# Altium footprint library pcb2D3D库101.PcbLib: 411 footprints (part 17 of 26)
Each footprint in its own frame and in the unit in brackets; x right, y up, seen from the top. Pads: shape width x height; smd on the part's side, far side on the other; paste and mask are expansions set on the pad; w line width, h text height; cw(c..) or ccw(c..) is an arc to the next point about the centre after c.
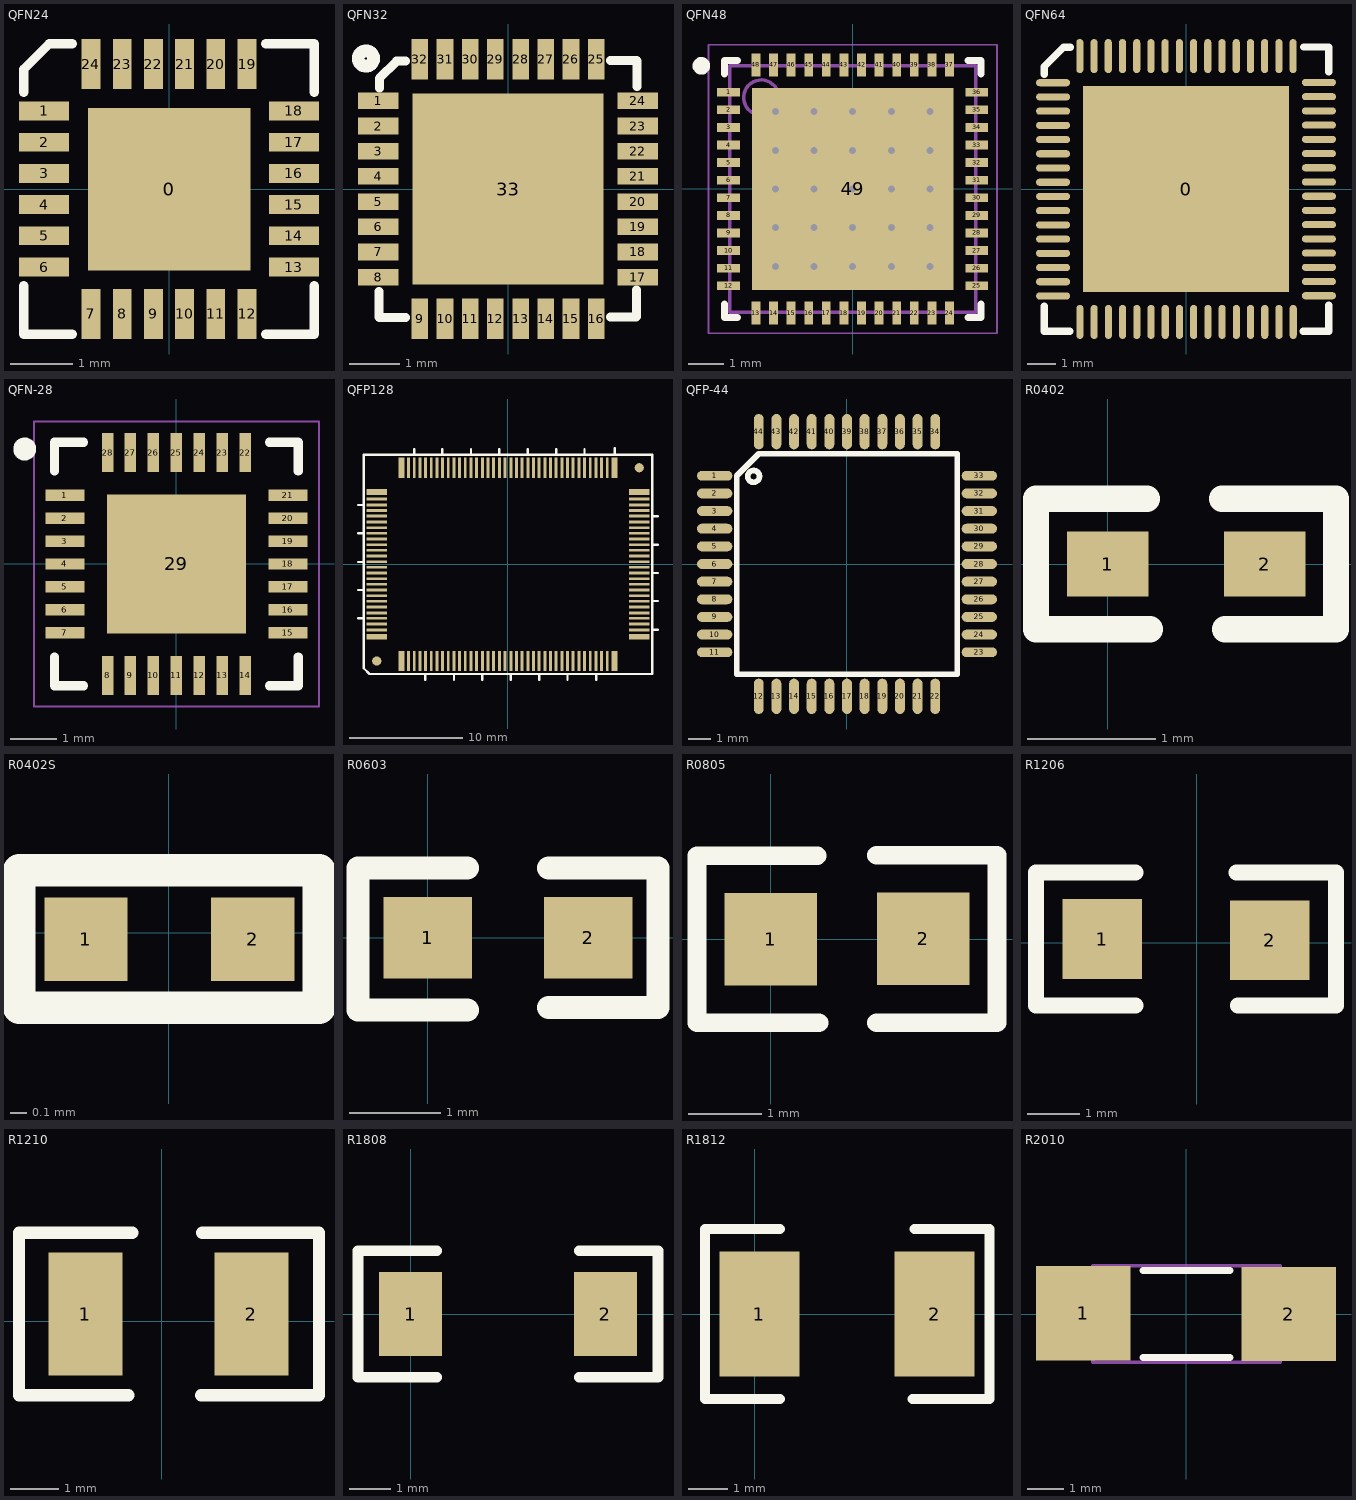
[diagram p16: the footprints below, top view; thin cyan lines are the x and y axes]

## QFN24 [mm]
pads (25):
  rect 2.6x2.6 smd: 0(0.005,0)
  rect 0.8x0.3 smd: 1(-2,1.25) 2(-2,0.75) 3(-2,0.25) 4(-2,-0.25) 5(-2,-0.75) 6(-2,-1.25) 13(2,-1.25) 14(2,-0.75) 15(2,-0.25) 16(2,0.25) 17(2,0.75) 18(2,1.25)
  rect 0.3x0.8 smd: 7(-1.25,-2) 8(-0.75,-2) 9(-0.25,-2) 10(0.25,-2) 11(0.75,-2) 12(1.25,-2) 19(1.25,2) 20(0.75,2) 21(0.25,2) 22(-0.25,2) 23(-0.75,2) 24(-1.25,2)
TopOverlay:
  lines w0.15: -2.325,-1.55 -2.325,-2.325 -1.55,-2.325 ; -2.325,1.55 -2.325,1.917 -1.917,2.325 -1.55,2.325 ; 1.55,-2.325 2.325,-2.325 2.325,-1.55 ; 1.55,2.325 2.325,2.325 2.325,1.55
3D body "QFN24.step": height 0.9, standoff 0, extent -1.997,-2.002 2.007,2.002

## QFN32 [mil]
pads (33):
  rect 31.5x13 smd: 1(-101.5,68.92) 2(-101.5,49.23) 3(-101.5,29.54) 4(-101.5,9.85) 5(-101.5,-9.85) 6(-101.5,-29.54) 7(-101.5,-49.23) 8(-101.5,-68.92) 17(101.5,-68.92) 18(101.5,-49.23) 19(101.5,-29.54) 20(101.5,-9.85) 21(101.5,9.85) 22(101.5,29.54) 23(101.5,49.23) 24(101.5,68.92)
  rect 13x31.5 smd: 9(-68.92,-101.5) 10(-49.23,-101.5) 11(-29.54,-101.5) 12(-9.85,-101.5) 13(9.85,-101.5) 14(29.54,-101.5) 15(49.23,-101.5) 16(68.92,-101.5) 25(68.92,101.5) 26(49.23,101.5) 27(29.54,101.5) 28(9.85,101.5) 29(-9.85,101.5) 30(-29.54,101.5) 31(-49.23,101.5) 32(-68.92,101.5)
  rect 149.61x149.61 smd: 33(0,0)
TopOverlay:
  circle w10: c-111,102 r6
  lines w7: -101,-80 -101,-100 -100.5,-100.5 -80,-100.5 ; -100.5,79 -100.5,86.5 -87,100 -80,100 ; 80,-100 100,-100 100.5,-99.5 100.5,-79 ; 80,100.5 100.5,100.5 101,100 101,80
3D body "qfn32-5x5.step": height 31.5, standoff 0, extent -98.2,-98.81 99.44,98.82

## QFN48 [mm] "QFN, 48-Leads, Body 7.00x7.00mm, Pitch 0.50mm, Thermal Pad 5.73x5.73mm, IPC Medium Density"
height 1
pads (49):
  rect 0.65x0.25 smd: 1(-3.525,2.75) 2(-3.525,2.25) 3(-3.525,1.75) 4(-3.525,1.25) 5(-3.525,0.75) 6(-3.525,0.25) 7(-3.525,-0.25) 8(-3.525,-0.75) 9(-3.525,-1.25) 10(-3.525,-1.75) 11(-3.525,-2.25) 12(-3.525,-2.75) 25(3.525,-2.75) 26(3.525,-2.25) 27(3.525,-1.75) 28(3.525,-1.25) 29(3.525,-0.75) 30(3.525,-0.25) 31(3.525,0.25) 32(3.525,0.75) 33(3.525,1.25) 34(3.525,1.75) 35(3.525,2.25) 36(3.525,2.75)
  rect 0.25x0.65 smd: 13(-2.75,-3.525) 14(-2.25,-3.525) 15(-1.75,-3.525) 16(-1.25,-3.525) 17(-0.75,-3.525) 18(-0.25,-3.525) 19(0.25,-3.525) 20(0.75,-3.525) 21(1.25,-3.525) 22(1.75,-3.525) 23(2.25,-3.525) 24(2.75,-3.525) 37(2.75,3.525) 38(2.25,3.525) 39(1.75,3.525) 40(1.25,3.525) 41(0.75,3.525) 42(0.25,3.525) 43(-0.25,3.525) 44(-0.75,3.525) 45(-1.25,3.525) 46(-1.75,3.525) 47(-2.25,3.525) 48(-2.75,3.525)
  rect 5.73x5.73 smd: 49(0,0)
via 2.2,-2.2 diameter 0.5 hole 0.2
via 1.1,-2.2 diameter 0.5 hole 0.2
via 0,-2.2 diameter 0.5 hole 0.2
via -1.1,-2.2 diameter 0.5 hole 0.2
via -2.2,-2.2 diameter 0.5 hole 0.2
via 2.2,-1.1 diameter 0.5 hole 0.2
via 1.1,-1.1 diameter 0.5 hole 0.2
via 0,-1.1 diameter 0.5 hole 0.2
via -1.1,-1.1 diameter 0.5 hole 0.2
via -2.2,-1.1 diameter 0.5 hole 0.2
via 2.2,0 diameter 0.5 hole 0.2
via 1.1,0 diameter 0.5 hole 0.2
via 0,0 diameter 0.5 hole 0.2
via -1.1,0 diameter 0.5 hole 0.2
via -2.2,0 diameter 0.5 hole 0.2
via 2.2,1.1 diameter 0.5 hole 0.2
via 1.1,1.1 diameter 0.5 hole 0.2
via 0,1.1 diameter 0.5 hole 0.2
via -1.1,1.1 diameter 0.5 hole 0.2
via -2.2,1.1 diameter 0.5 hole 0.2
via 2.2,2.2 diameter 0.5 hole 0.2
via 1.1,2.2 diameter 0.5 hole 0.2
via 0,2.2 diameter 0.5 hole 0.2
via -1.1,2.2 diameter 0.5 hole 0.2
via -2.2,2.2 diameter 0.5 hole 0.2
TopOverlay:
  circle w0.25: c-4.3,3.5 r0.125
  lines w0.2: -3.65,-3.275 -3.65,-3.65 -3.275,-3.65 ; -3.65,3.275 -3.65,3.65 -3.275,3.65 ; 3.275,-3.65 3.65,-3.65 3.65,-3.275 ; 3.275,3.65 3.65,3.65 3.65,3.275
Mechanical13:
  circle w0.1: c-2.6,2.6 r0.5
  lines w0.1: -3.5,-3.5 3.5,-3.5 3.5,3.5 -3.5,3.5 -3.5,-3.5
Mechanical15:
  lines w0.05: -4.1,-4.1 4.1,-4.1 4.1,4.1 -4.1,4.1 -4.1,-4.1
  lines w0.1: -0.5,0 0.5,0 ; 0,-0.5 0,0.5
3D body: height 1, standoff 0.08, extent -3.5,-3.556 3.5,3.444

## QFN64 [mm]
pads (65):
  rect 7.25x7.25 smd: 0(0,-0.001)
  oval 1.2x0.25 smd: 1(-4.674,3.738) 2(-4.674,3.238) 3(-4.674,2.738) 4(-4.674,2.238) 5(-4.674,1.738) 6(-4.674,1.238) 7(-4.674,0.738) 8(-4.674,0.238) 9(-4.674,-0.262) 10(-4.674,-0.762) 11(-4.674,-1.262) 12(-4.674,-1.762) 13(-4.674,-2.262) 14(-4.674,-2.762) 15(-4.674,-3.262) 16(-4.674,-3.762) 33(4.674,-3.754) 34(4.674,-3.254) 35(4.674,-2.754) 36(4.674,-2.254) 37(4.674,-1.754) 38(4.674,-1.254) 39(4.674,-0.754) 40(4.674,-0.254) 41(4.674,0.246) 42(4.674,0.746) 43(4.674,1.246) 44(4.674,1.746) 45(4.674,2.246) 46(4.674,2.746) 47(4.674,3.246) 48(4.674,3.746)
  oval 0.25x1.2 smd: 17(-3.73,-4.675) 18(-3.23,-4.675) 19(-2.73,-4.675) 20(-2.23,-4.675) 21(-1.73,-4.675) 22(-1.23,-4.675) 23(-0.73,-4.675) 24(-0.23,-4.675) 25(0.27,-4.675) 26(0.77,-4.675) 27(1.27,-4.675) 28(1.77,-4.675) 29(2.27,-4.675) 30(2.77,-4.675) 31(3.27,-4.675) 32(3.77,-4.675) 49(3.767,4.675) 50(3.267,4.675) 51(2.767,4.675) 52(2.267,4.675) 53(1.767,4.675) 54(1.267,4.675) 55(0.767,4.675) 56(0.267,4.675) 57(-0.233,4.675) 58(-0.733,4.675) 59(-1.233,4.675) 60(-1.733,4.675) 61(-2.233,4.675) 62(-2.733,4.675) 63(-3.233,4.675) 64(-3.733,4.675)
TopOverlay:
  lines w0.254: -4.983,-4.116 -4.983,-5.004 -4.089,-5.004 ; -4.983,4.032 -4.983,4.312 -4.31,4.985 -4.064,4.985 ; 4.115,-5.004 5.017,-5.004 5.017,-4.091 ; 4.14,4.995 5.017,4.996 5.017,4.113
3D body "User Library-QFN64-2.step": height 0.9, standoff 0, extent -4.52,-4.521 4.52,4.519

## QFN-28 [mm] "QFN, 28-Leads, Body 5.00x5.00mm, Pitch 0.50mm, Thermal Pad 3.03x3.03mm, IPC Medium Density"
height 0.9
pads (29):
  rect 0.85x0.25 smd: 1(-2.425,1.5) 2(-2.425,1) 3(-2.425,0.5) 4(-2.425,0) 5(-2.425,-0.5) 6(-2.425,-1) 7(-2.425,-1.5) 15(2.425,-1.5) 16(2.425,-1) 17(2.425,-0.5) 18(2.425,0) 19(2.425,0.5) 20(2.425,1) 21(2.425,1.5)
  rect 0.25x0.85 smd: 8(-1.5,-2.425) 9(-1,-2.425) 10(-0.5,-2.425) 11(0,-2.425) 12(0.5,-2.425) 13(1,-2.425) 14(1.5,-2.425) 22(1.5,2.425) 23(1,2.425) 24(0.5,2.425) 25(0,2.425) 26(-0.5,2.425) 27(-1,2.425) 28(-1.5,2.425)
  rect 3.03x3.03 smd: 29(0,0)
TopOverlay:
  circle w0.25: c-3.3,2.5 r0.125
  lines w0.2: -2.65,-2.025 -2.65,-2.65 -2.025,-2.65 ; -2.65,2.025 -2.65,2.65 -2.025,2.65 ; 2.025,-2.65 2.65,-2.65 2.65,-2.025 ; 2.025,2.65 2.65,2.65 2.65,2.025
Mechanical15:
  lines w0.05: -3.1,-3.1 -3.1,3.1 3.1,3.1 3.1,-3.1 -3.1,-3.1
  lines w0.1: -0.5,0 0.5,0 ; 0,-0.5 0,0.5
3D body "User Library-QFN28.STEP": height 0.9, standoff 0, extent -2.5,-2.525 2.54,2.515

## QFP128 [mil]
pads (130):
  rect 20x70 smd: 1(-369,-335) 38(369,-335) 65(369,335) 102(-369,335)
  rect 10x70 smd: 2(-345,-335) 3(-325,-335) 4(-305,-335) 5(-286,-335) 6(-266,-335) 7(-246,-335) 8(-227,-335) 9(-207,-335) 10(-187,-335) 11(-168,-335) 12(-148,-335) 13(-128,-335) 14(-109,-335) 15(-89,-335) 16(-69,-335) 17(-50,-335) 18(-30,-335) 19(-10,-335) 20(10,-335) 21(29,-335) 22(49,-335) 23(69,-335) 24(88,-335) 25(108,-335) 26(128,-335) 27(147,-335) 28(167,-335) 29(187,-335) 30(206,-335) 31(226,-335) 32(246,-335) 33(265,-335) 34(285,-335) 35(305,-335) 36(324,-335) 37(344,-335) 66(344,335) 67(324,335) 68(305,335) 69(285,335) 70(265,335) 71(246,335) 72(226,335) 73(206,335) 74(187,335) 75(167,335) 76(147,335) 77(128,335) 78(108,335) 79(88,335) 80(69,335) 81(49,335) 82(29,335) 83(10,335) 84(-10,335) 85(-30,335) 86(-50,335) 87(-69,335) 88(-89,335) 89(-109,335) 90(-128,335) 91(-148,335) 92(-168,335) 93(-187,335) 94(-207,335) 95(-227,335) 96(-246,335) 97(-266,335) 98(-286,335) 99(-305,335) 100(-325,335) 101(-345,335)
  rect 70x20 smd: 39(455,-251) 64(455,251) 103(-455,251) 128(-455,-251)
  rect 70x10 smd: 40(455,-227) 41(455,-207) 42(455,-187) 43(455,-168) 44(455,-148) 45(455,-128) 46(455,-109) 47(455,-89) 48(455,-69) 49(455,-50) 50(455,-30) 51(455,-10) 52(455,9) 53(455,29) 54(455,49) 55(455,68) 56(455,88) 57(455,108) 58(455,127) 59(455,147) 60(455,167) 61(455,187) 62(455,206) 63(455,226) 104(-455,226) 105(-455,206) 106(-455,187) 107(-455,167) 108(-455,147) 109(-455,127) 110(-455,108) 111(-455,88) 112(-455,68) 113(-455,49) 114(-455,29) 115(-455,9) 116(-455,-10) 117(-455,-30) 118(-455,-50) 119(-455,-69) 120(-455,-89) 121(-455,-109) 122(-455,-128) 123(-455,-148) 124(-455,-168) 125(-455,-187) 126(-455,-207) 127(-455,-227)
  round 32 smd: 129(-455,-335) 130(455,335)
TopOverlay:
  lines w8: -520,-187 -500,-187 ; -520,-89 -500,-89 ; -520,8 -500,8 ; -520,108 -500,108 ; -520,205.5 -500,205.5 ; -325,380 -325,400 ; -287,-400 -287,-380 ; -227.5,380 -227.5,400 ; -187,-400 -187,-380 ; -128,380 -128,400 ; -89.5,-400 -89.5,-380 ; -30,380 -30,400 ; 10,-400 10,-380 ; 69,380 69,400 ; 108,-400 108,-380 ; 167.5,380 167.5,400 ; 206,-400 206,-380 ; 265,380 265,400 ; 305.5,-400 305.5,-380 ; 370,382.5 370,402.5 ; 500,-227 520,-227 ; 500,-127 520,-127 ; 500,-30 520,-30 ; 500,68 520,68 ; 500,167 520,167 ; -500,-360 -480,-380 500,-380 500,380 -500,380 -500,-360
3D body "User Library-QFP5-128.step": height 114.17, standoff 0, extent -457.39,-339.17 456,338

## QFP-44 [mm]
pads (44):
  oval 1.6x0.45 smd: 1(-6,4) 2(-6,3.2) 3(-6,2.4) 4(-6,1.6) 5(-6,0.8) 6(-6,0) 7(-6,-0.8) 8(-6,-1.6) 9(-6,-2.4) 10(-6,-3.2) 11(-6,-4) 23(6,-4) 24(6,-3.2) 25(6,-2.4) 26(6,-1.6) 27(6,-0.8) 28(6,0) 29(6,0.8) 30(6,1.6) 31(6,2.4) 32(6,3.2) 33(6,4)
  oval 0.45x1.6 smd: 12(-4,-6) 13(-3.2,-6) 14(-2.4,-6) 15(-1.6,-6) 16(-0.8,-6) 17(0,-6) 18(0.8,-6) 19(1.6,-6) 20(2.4,-6) 21(3.2,-6) 22(4,-6) 34(4,6) 35(3.2,6) 36(2.4,6) 37(1.6,6) 38(0.8,6) 39(0,6) 40(-0.8,6) 41(-1.6,6) 42(-2.4,6) 43(-3.2,6) 44(-4,6)
TopOverlay:
  circle w0.254: c-4.232,3.972 r0.267
  lines w0.254: -5,-5 -5,4 -4,5 5,5 5,-5 -5,-5
3D body: height 1.15, standoff 0, extent -4.484,3.489 -3.488,4.487
3D body "User Library-44 pin tqfp ic package.STEP": height 1.1, standoff -0.01, extent -5.975,-5.975 6.025,6.025

## R0402 [mil] "1/16W"
pads (2):
  rect 25x20 smd: 1(0,0) 2(48.2,0)
TopOverlay:
  lines w8: 12,20 -22,20 -22,-20 13,-20 ; 35,20 70,20 70,-20 36,-20
3D body "R0402.STEP": height 13.78, standoff 0, extent 4.71,-9.79 44.09,9.9

## R0402S [mil] "1/16W"
pads (2):
  rect 20x20 smd: 1(-19.93,-1.58) 2(20.07,-1.58)
TopOverlay:
  lines w7.87: -36,-18 -36,15 36,15 36,-18 -36,-18
3D body "R0402.STEP": height 13.78, standoff 0, extent -19.59,-11.6 19.79,8.09

## R0603 [mil] "1/10W"
pads (2):
  rect 38x35 smd: 1(0,0) 2(69,0)
TopOverlay:
  lines w10: 17,-31 -30,-31 -30,30 17,30 ; 52,-30 99,-30 99,30 52,30
3D body "R0603.STEP": height 17.72, standoff 0, extent 3.51,-15.74 66.5,15.75

## R0805 [mm] "1/8W"
pads (2):
  rect 1.27x1.27 smd: 1(0,0) 2(2.09,0.005)
TopOverlay:
  lines w0.254: 0.635,1.143 -1.011,1.143 -1.011,-1.143 0.66,-1.143 ; 1.448,-1.143 3.099,-1.143 3.099,1.148 1.448,1.148
3D body "R0805.STEP": height 0.55, standoff 0, extent 0.036,-0.62 2.036,0.64

## R1206 [mil] "1/4W"
pads (2):
  rect 60x60 smd: 1(-71,3) 2(55,2)
TopOverlay:
  lines w12: -46,-47 -121,-47 -121,53 -46,53 ; 30,53 105,53 105,-47 31,-47
3D body "R1206.STEP": height 23.62, standoff 0, extent -70.99,-29.49 55,33.5

## R1210 [mil] "1/3W"
pads (2):
  rect 60x100 smd: 1(-62,6) 2(73,6)
TopOverlay:
  lines w10: -27,-60 -116,-60 -116,72 -24,72 ; 32,-60 128,-60 128,72 ; 33,72 126.8,72
3D body "1210(3225M) Cap.STEP": height 67.1, standoff 0, extent -72.75,-44 84.75,54

## R1808 [mil]
pads (2):
  rect 60x80 smd: 1(0,0) 2(185,0)
TopOverlay:
  lines w10: 25,-60 -50,-60 -50,60 25,60 ; 160,-60 235,-60 235,60 160,60
3D body "R1808(4520M)1.STEP": height 39.37, standoff 0, extent 2,-39 179.77,37.49

## R1812 [mil]
pads (2):
  rect 80x125 smd: 1(4.39,-0.02) 2(180,-0.02)
TopOverlay:
  lines w10: 25,-85 -50,-85 -50,85 25,85 ; 158,-85 160,-85 235,-85 235,85 160,85 ; 159,-85 161,-85
3D body "1812 SMD Resistor.step": height 63.07, standoff 0, extent 5.42,-62 182.58,63.98

## R2010 [mm] "Chip Resistor, Body 5.0x2.5mm, IPC High Density"
height 0.9
pads (2):
  rect 2.6x2.6 smd: 1(-2.845,0.025) 2(2.819,0)
TopOverlay:
  lines w0.2: -1.2,-1.2 1.2,-1.2 ; -1.2,1.2 1.2,1.2
Mechanical13:
  lines w0.1: -2.575,-1.325 -2.575,1.325 2.575,1.325 2.575,-1.325 -2.575,-1.325
3D body "User Library-res2010.STEP": height 0.57, standoff -0.05, extent -3,-1.35 3,1.35